# Altium footprint library rus.PcbLib: 83 footprints (part 6 of 6)
Each footprint in its own frame and in the unit in brackets; x right, y up, seen from the top. Pads: shape width x height; smd on the part's side, far side on the other; paste and mask are expansions set on the pad; w line width, h text height; cw(c..) or ccw(c..) is an arc to the next point about the centre after c.
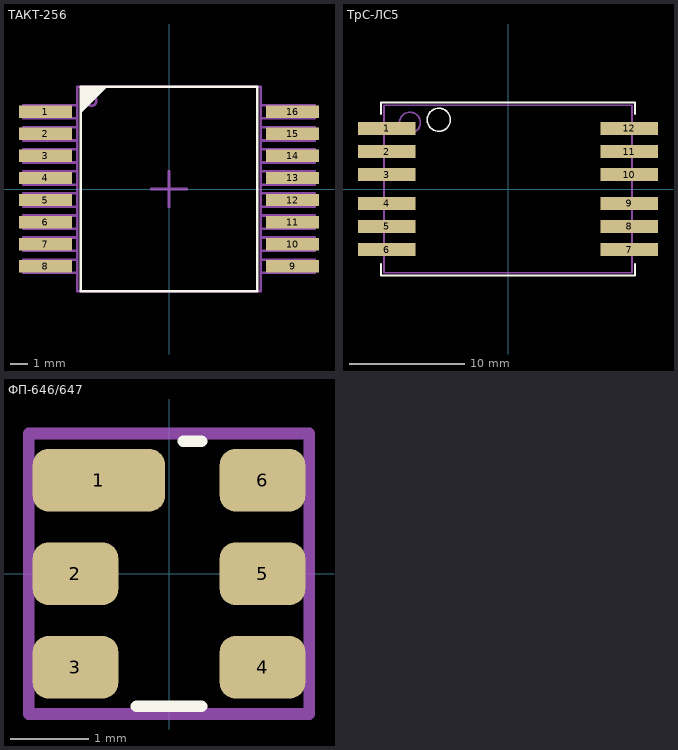
[diagram p5: the footprints below, top view; thin cyan lines are the x and y axes]

## ТАКТ-256 [mm]
height 2.8
pads (16):
  rect 3x0.7 smd: 1(-7,4.375) 2(-7,3.125) 3(-7,1.875) 4(-7,0.625) 5(-7,-0.625) 6(-7,-1.875) 7(-7,-3.125) 8(-7,-4.375) 9(7,-4.375) 10(7,-3.125) 11(7,-1.875) 12(7,-0.625) 13(7,0.625) 14(7,1.875) 15(7,3.125) 16(7,4.375)
Top Overlay:
  region: -3.5,5.8 -5,5.8 -5,4.3
  lines w0.15: -5,-5.8 -5,5.8 5,5.8 5,-5.8 -5,-5.8
Mechanical 15:
  lines w0.15: -1,0 1,0 ; 0,-1 0,1
Mechanical 29:
  circle w0.15: c-4.4,5 r0.283
  lines w0.15: -5.2,-4.75 -8.25,-4.75 -8.25,-4 -5.2,-4 ; -5.2,-3.5 -8.25,-3.5 -8.25,-2.75 -5.2,-2.75 ; -5.2,-2.25 -8.25,-2.25 -8.25,-1.5 -5.2,-1.5 ; -5.2,-1 -8.25,-1 -8.25,-0.25 -5.2,-0.25 ; -5.2,0.25 -8.25,0.25 -8.25,1 -5.2,1 ; -5.2,1.5 -8.25,1.5 -8.25,2.25 -5.2,2.25 ; -5.2,2.75 -8.25,2.75 -8.25,3.5 -5.2,3.5 ; -5.2,4 -8.25,4 -8.25,4.75 -5.2,4.75 ; 5.2,-4.75 8.25,-4.75 8.25,-4 5.2,-4 ; 5.2,-3.5 8.25,-3.5 8.25,-2.75 5.2,-2.75 ; 5.2,-2.25 8.25,-2.25 8.25,-1.5 5.2,-1.5 ; 5.2,-1 8.25,-1 8.25,-0.25 5.2,-0.25 ; 5.2,0.25 8.25,0.25 8.25,1 5.2,1 ; 5.2,1.5 8.25,1.5 8.25,2.25 5.2,2.25 ; 5.2,2.75 8.25,2.75 8.25,3.5 5.2,3.5 ; 5.2,4 8.25,4 8.25,4.75 5.2,4.75 ; -5.2,-5.8 -5.2,5.8 5.2,5.8 5.2,-5.8 -5.2,-5.8
  text ".Designator" at -3.1,-0.2 h1
3D body: height 2.8, standoff 0, extent -5.199,-5.799 5.199,5.799

## ТрС-ЛС5 [mm]
pads (12):
  rect 5x1.1 smd: 1(-10.5,5.25) 2(-10.5,3.25) 3(-10.5,1.25) 4(-10.5,-1.25) 5(-10.5,-3.25) 6(-10.5,-5.25) 7(10.5,-5.25) 8(10.5,-3.25) 9(10.5,-1.25) 10(10.5,1.25) 11(10.5,3.25) 12(10.5,5.25)
Top Overlay:
  circle w0.15: c-6,6 r1
  lines w0.15: -11,-6.5 -11,-7.5 11,-7.5 11,-6.5 ; -11,6.5 -11,7.5 11,7.5 11,6.5
Mechanical 29:
  circle w0.15: c-8.5,5.75 r0.901
  lines w0.15: -10.75,-7.25 10.75,-7.25 10.75,7.25 -10.75,7.25 -10.75,-7.25
  text ".Designator" at -3.8,0.1 h1
3D body: height 5.8, standoff 1, extent -8.75,-6.5 8.75,6.5
3D body: height 1, standoff 0.1, extent -10.75,-7.25 10.75,7.25

## ФП-646/647 [mm]
pads (6):
  rrect50% 1.7x0.8 smd: 1(-0.9,1.2)
  rrect50% 1.1x0.8 smd: 2(-1.2,0) 3(-1.2,-1.2) 4(1.2,-1.2) 5(1.2,0) 6(1.2,1.2)
Top Overlay:
  lines w0.15: -0.417,-1.7 0.417,-1.7 ; 0.183,1.7 0.417,1.7
  text "." at -1.8,2.1 h0.1
Top Courtyard:
  lines w0.15: -1.8,-1.8 -1.8,1.8 1.8,1.8 1.8,-1.8 -1.8,-1.8
3D body: height 1.4, standoff 0, extent -1.5,-1.5 1.5,1.5